# Altium schematic symbol library jlcpcb_2025_04_capacitors_extended_1206.schlib: 2503 symbols (part 12 of 14)
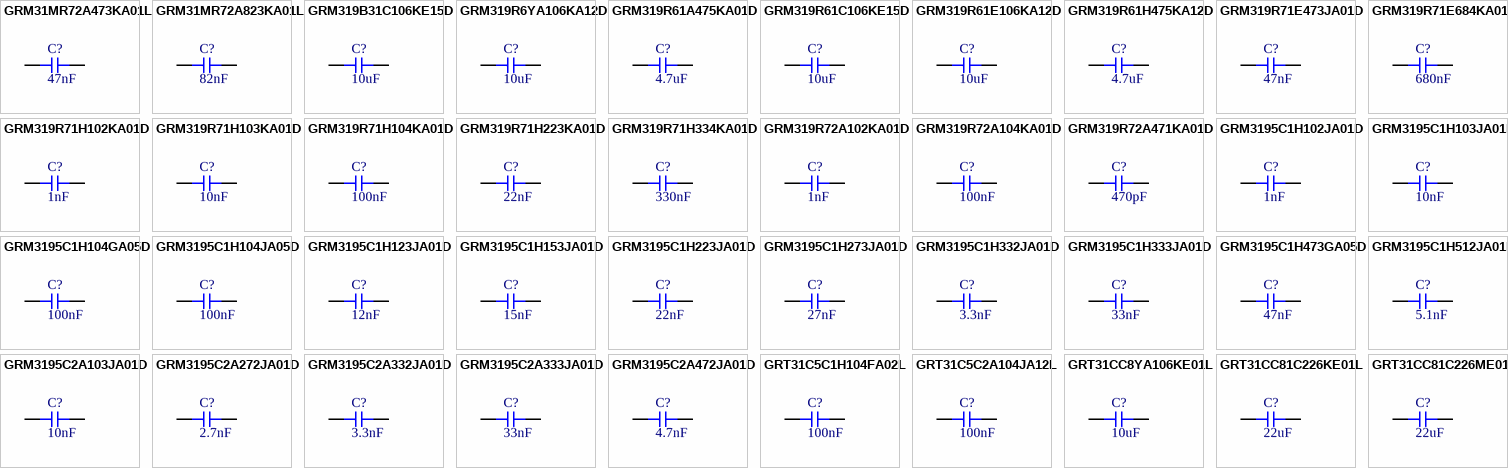
[diagram p73: symbols GRM31MR72A473KA01L to GRT31CC81C226ME01L]

## GRM319R71E684KA01D
designator C?  Capacitance: 680nF  (hidden comment: *)
Capacitor, Ceramic (MLCC), 680nF, ±10%, 25V, X7R, ±10%, SMD 1206; Manufacturer: Murata Electronics; Manufacturer Part Number: GRM319R71E684KA01D; Package Size: 1206; JLCPCB Basic Part: No; JLCPCB Part Number: C913695; Supplier 1: LCSC; Category: Capacitors - MLCC; Supplier Part Number 1: C913695; Tolerance: ±10%; Voltage Rating: 25V; Temperature Coefficient: X7R; RoHS: Yes; ComponentLink1Description: Datasheet; ComponentLink1URL: https://wmsc.lcsc.com/wmsc/upload/file/pdf/v2/lcsc/2304140030_Murata-Electronics-GRM319R71E684KA01D_C913695.pdf; ComponentLink2Description: JLCPCB Part URL; ComponentLink2URL: https://jlcpcb.com/partdetail/C913695; ComponentLink3Description: LCSC Part URL; ComponentLink3URL: https://lcsc.com/product-detail/Multilayer-Ceramic-Capacitors-MLCC---SMD-SMT_Murata-Electronics-Murata-Electronics-GRM319R71E684KA01D_C913695.html
footprint CAP-1206 (1206 (3216M) Capacitor)
pins: 1, 2

## GRM319R71H102KA01D
designator C?  Capacitance: 1nF  (hidden comment: *)
Capacitor, Ceramic (MLCC), 1nF, ±10%, 50V, X7R, ±10%, SMD 1206; Manufacturer: Murata Electronics; Manufacturer Part Number: GRM319R71H102KA01D; Package Size: 1206; JLCPCB Basic Part: No; JLCPCB Part Number: C440200; Supplier 1: LCSC; Category: Capacitors - MLCC; Supplier Part Number 1: C440200; Tolerance: ±10%; Voltage Rating: 50V; Temperature Coefficient: X7R; RoHS: Yes; ComponentLink1Description: Datasheet; ComponentLink1URL: https://wmsc.lcsc.com/wmsc/upload/file/pdf/v2/lcsc/2304140030_Murata-Electronics-GRM319R71H102KA01D_C440200.pdf; ComponentLink2Description: JLCPCB Part URL; ComponentLink2URL: https://jlcpcb.com/partdetail/C440200; ComponentLink3Description: LCSC Part URL; ComponentLink3URL: https://lcsc.com/product-detail/Multilayer-Ceramic-Capacitors-MLCC---SMD-SMT_Murata-Electronics-Murata-Electronics-GRM319R71H102KA01D_C440200.html
footprint CAP-1206 (1206 (3216M) Capacitor)
pins: 1, 2

## GRM319R71H103KA01D
designator C?  Capacitance: 10nF  (hidden comment: *)
Capacitor, Ceramic (MLCC), 10nF, ±10%, 50V, X7R, ±10%, SMD 1206; Manufacturer: Murata Electronics; Manufacturer Part Number: GRM319R71H103KA01D; Package Size: 1206; JLCPCB Basic Part: No; JLCPCB Part Number: C521245; Supplier 1: LCSC; Category: Capacitors - MLCC; Supplier Part Number 1: C521245; Tolerance: ±10%; Voltage Rating: 50V; Temperature Coefficient: X7R; RoHS: Yes; ComponentLink1Description: Datasheet; ComponentLink1URL: https://wmsc.lcsc.com/wmsc/upload/file/pdf/v2/lcsc/2304140030_Murata-Electronics-GRM319R71H103KA01D_C521245.pdf; ComponentLink2Description: JLCPCB Part URL; ComponentLink2URL: https://jlcpcb.com/partdetail/C521245; ComponentLink3Description: LCSC Part URL; ComponentLink3URL: https://lcsc.com/product-detail/Multilayer-Ceramic-Capacitors-MLCC---SMD-SMT_Murata-Electronics-Murata-Electronics-GRM319R71H103KA01D_C521245.html
footprint CAP-1206 (1206 (3216M) Capacitor)
pins: 1, 2

## GRM319R71H104KA01D
designator C?  Capacitance: 100nF  (hidden comment: *)
Capacitor, Ceramic (MLCC), 100nF, ±10%, 50V, X7R, ±10%, SMD 1206; Manufacturer: Murata Electronics; Manufacturer Part Number: GRM319R71H104KA01D; Package Size: 1206; JLCPCB Basic Part: No; JLCPCB Part Number: C86047; Supplier 1: LCSC; Category: Capacitors - MLCC; Supplier Part Number 1: C86047; Tolerance: ±10%; Voltage Rating: 50V; Temperature Coefficient: X7R; RoHS: Yes; ComponentLink1Description: Datasheet; ComponentLink1URL: https://wmsc.lcsc.com/wmsc/upload/file/pdf/v2/lcsc/2304140030_Murata-Electronics-GRM319R71H104KA01D_C86047.pdf; ComponentLink2Description: JLCPCB Part URL; ComponentLink2URL: https://jlcpcb.com/partdetail/C86047; ComponentLink3Description: LCSC Part URL; ComponentLink3URL: https://lcsc.com/product-detail/Multilayer-Ceramic-Capacitors-MLCC---SMD-SMT_Murata-Electronics-Murata-Electronics-GRM319R71H104KA01D_C86047.html
footprint CAP-1206 (1206 (3216M) Capacitor)
pins: 1, 2

## GRM319R71H223KA01D
designator C?  Capacitance: 22nF  (hidden comment: *)
Capacitor, Ceramic (MLCC), 22nF, ±10%, 50V, X7R, ±10%, SMD 1206; Manufacturer: Murata Electronics; Manufacturer Part Number: GRM319R71H223KA01D; Package Size: 1206; JLCPCB Basic Part: No; JLCPCB Part Number: C124126; Supplier 1: LCSC; Category: Capacitors - MLCC; Supplier Part Number 1: C124126; Tolerance: ±10%; Voltage Rating: 50V; Temperature Coefficient: X7R; RoHS: Yes; ComponentLink1Description: Datasheet; ComponentLink1URL: https://wmsc.lcsc.com/wmsc/upload/file/pdf/v2/lcsc/1810201307_Murata-Electronics-GRM319R71H223KA01D_C124126.pdf; ComponentLink2Description: JLCPCB Part URL; ComponentLink2URL: https://jlcpcb.com/partdetail/C124126; ComponentLink3Description: LCSC Part URL; ComponentLink3URL: https://lcsc.com/product-detail/Multilayer-Ceramic-Capacitors-MLCC---SMD-SMT_Murata-Electronics-Murata-Electronics-GRM319R71H223KA01D_C124126.html
footprint CAP-1206 (1206 (3216M) Capacitor)
pins: 1, 2

## GRM319R71H334KA01D
designator C?  Capacitance: 330nF  (hidden comment: *)
Capacitor, Ceramic (MLCC), 330nF, ±10%, null, X7R, ±10%, SMD 1206; Manufacturer: Murata Electronics; Manufacturer Part Number: GRM319R71H334KA01D; Package Size: 1206; JLCPCB Basic Part: No; JLCPCB Part Number: C913734; Supplier 1: LCSC; Category: Capacitors - MLCC; Supplier Part Number 1: C913734; Tolerance: ±10%; Voltage Rating: null; Temperature Coefficient: X7R; RoHS: Yes; ComponentLink1Description: Datasheet; ComponentLink1URL: https://wmsc.lcsc.com/wmsc/upload/file/pdf/v2/lcsc/2201131300_Murata-Electronics-GRM319R71H334KA01D_C913734.pdf; ComponentLink2Description: JLCPCB Part URL; ComponentLink2URL: https://jlcpcb.com/partdetail/C913734; ComponentLink3Description: LCSC Part URL; ComponentLink3URL: https://lcsc.com/product-detail/Multilayer-Ceramic-Capacitors-MLCC---SMD-SMT_Murata-Electronics-Murata-Electronics-GRM319R71H334KA01D_C913734.html
footprint CAP-1206 (1206 (3216M) Capacitor)
pins: 1, 2

## GRM319R72A102KA01D
designator C?  Capacitance: 1nF  (hidden comment: *)
Capacitor, Ceramic (MLCC), 1nF, ±10%, 100V, X7R, ±10%, SMD 1206; Manufacturer: Murata Electronics; Manufacturer Part Number: GRM319R72A102KA01D; Package Size: 1206; JLCPCB Basic Part: No; JLCPCB Part Number: C162438; Supplier 1: LCSC; Category: Capacitors - MLCC; Supplier Part Number 1: C162438; Tolerance: ±10%; Voltage Rating: 100V; Temperature Coefficient: X7R; RoHS: Yes; ComponentLink1Description: Datasheet; ComponentLink1URL: https://wmsc.lcsc.com/wmsc/upload/file/pdf/v2/lcsc/2308111642_Murata-Electronics-GRM319R72A102KA01D_C162438.pdf; ComponentLink2Description: JLCPCB Part URL; ComponentLink2URL: https://jlcpcb.com/partdetail/C162438; ComponentLink3Description: LCSC Part URL; ComponentLink3URL: https://lcsc.com/product-detail/Multilayer-Ceramic-Capacitors-MLCC---SMD-SMT_Murata-Electronics-Murata-Electronics-GRM319R72A102KA01D_C162438.html
footprint CAP-1206 (1206 (3216M) Capacitor)
pins: 1, 2

## GRM319R72A104KA01D
designator C?  Capacitance: 100nF  (hidden comment: *)
Capacitor, Ceramic (MLCC), 100nF, ±10%, 100V, X7R, ±10%, SMD 1206; Manufacturer: Murata Electronics; Manufacturer Part Number: GRM319R72A104KA01D; Package Size: 1206; JLCPCB Basic Part: No; JLCPCB Part Number: C97932; Supplier 1: LCSC; Category: Capacitors - MLCC; Supplier Part Number 1: C97932; Tolerance: ±10%; Voltage Rating: 100V; Temperature Coefficient: X7R; RoHS: Yes; ComponentLink1Description: Datasheet; ComponentLink1URL: https://wmsc.lcsc.com/wmsc/upload/file/pdf/v2/lcsc/1810201314_Murata-Electronics-GRM319R72A104KA01D_C97932.pdf; ComponentLink2Description: JLCPCB Part URL; ComponentLink2URL: https://jlcpcb.com/partdetail/C97932; ComponentLink3Description: LCSC Part URL; ComponentLink3URL: https://lcsc.com/product-detail/Multilayer-Ceramic-Capacitors-MLCC---SMD-SMT_Murata-Electronics-Murata-Electronics-GRM319R72A104KA01D_C97932.html
footprint CAP-1206 (1206 (3216M) Capacitor)
pins: 1, 2

## GRM319R72A471KA01D
designator C?  Capacitance: 470pF  (hidden comment: *)
Capacitor, Ceramic (MLCC), 470pF, ±10%, ±10%, SMD 1206; Manufacturer: Murata Electronics; Manufacturer Part Number: GRM319R72A471KA01D; Package Size: 1206; JLCPCB Basic Part: No; JLCPCB Part Number: C913733; Supplier 1: LCSC; Category: Capacitors - MLCC; Supplier Part Number 1: C913733; Tolerance: ±10%; RoHS: Yes; ComponentLink1Description: Datasheet; ComponentLink1URL: https://wmsc.lcsc.com/wmsc/upload/file/pdf/v2/lcsc/2304140030_Murata-Electronics-GRM319R72A471KA01D_C913733.pdf; ComponentLink2Description: JLCPCB Part URL; ComponentLink2URL: https://jlcpcb.com/partdetail/C913733; ComponentLink3Description: LCSC Part URL; ComponentLink3URL: https://lcsc.com/product-detail/Multilayer-Ceramic-Capacitors-MLCC---SMD-SMT_Murata-Electronics-Murata-Electronics-GRM319R72A471KA01D_C913733.html
footprint CAP-1206 (1206 (3216M) Capacitor)
pins: 1, 2

## GRM3195C1H102JA01D
designator C?  Capacitance: 1nF  (hidden comment: *)
Capacitor, Ceramic (MLCC), 1nF, ±5%, 50V, C0G, ±5%, SMD 1206; Manufacturer: Murata Electronics; Manufacturer Part Number: GRM3195C1H102JA01D; Package Size: 1206; JLCPCB Basic Part: No; JLCPCB Part Number: C162431; Supplier 1: LCSC; Category: Capacitors - MLCC; Supplier Part Number 1: C162431; Tolerance: ±5%; Voltage Rating: 50V; Temperature Coefficient: C0G; RoHS: Yes; ComponentLink1Description: Datasheet; ComponentLink1URL: https://wmsc.lcsc.com/wmsc/upload/file/pdf/v2/lcsc/1810201331_Murata-Electronics-GRM3195C1H102JA01D_C162431.pdf; ComponentLink2Description: JLCPCB Part URL; ComponentLink2URL: https://jlcpcb.com/partdetail/C162431; ComponentLink3Description: LCSC Part URL; ComponentLink3URL: https://lcsc.com/product-detail/Multilayer-Ceramic-Capacitors-MLCC---SMD-SMT_Murata-Electronics-Murata-Electronics-GRM3195C1H102JA01D_C162431.html
footprint CAP-1206 (1206 (3216M) Capacitor)
pins: 1, 2

## GRM3195C1H103JA01D
designator C?  Capacitance: 10nF  (hidden comment: *)
Capacitor, Ceramic (MLCC), 10nF, ±5%, 50V, C0G, ±5%, SMD 1206; Manufacturer: Murata Electronics; Manufacturer Part Number: GRM3195C1H103JA01D; Package Size: 1206; JLCPCB Basic Part: No; JLCPCB Part Number: C97928; Supplier 1: LCSC; Category: Capacitors - MLCC; Supplier Part Number 1: C97928; Tolerance: ±5%; Voltage Rating: 50V; Temperature Coefficient: C0G; RoHS: Yes; ComponentLink1Description: Datasheet; ComponentLink1URL: https://wmsc.lcsc.com/wmsc/upload/file/pdf/v2/lcsc/1810201314_Murata-Electronics-GRM3195C1H103JA01D_C97928.pdf; ComponentLink2Description: JLCPCB Part URL; ComponentLink2URL: https://jlcpcb.com/partdetail/C97928; ComponentLink3Description: LCSC Part URL; ComponentLink3URL: https://lcsc.com/product-detail/Multilayer-Ceramic-Capacitors-MLCC---SMD-SMT_Murata-Electronics-Murata-Electronics-GRM3195C1H103JA01D_C97928.html
footprint CAP-1206 (1206 (3216M) Capacitor)
pins: 1, 2

## GRM3195C1H104GA05D
designator C?  Capacitance: 100nF  (hidden comment: *)
Capacitor, Ceramic (MLCC), 100nF, ±2%, null, null, ±2%, SMD 1206; Manufacturer: Murata Electronics; Manufacturer Part Number: GRM3195C1H104GA05D; Package Size: 1206; JLCPCB Basic Part: No; JLCPCB Part Number: C907944; Supplier 1: LCSC; Category: Capacitors - MLCC; Supplier Part Number 1: C907944; Tolerance: ±2%; Voltage Rating: null; Temperature Coefficient: null; RoHS: Yes; ComponentLink1Description: Datasheet; ComponentLink1URL: https://wmsc.lcsc.com/wmsc/upload/file/pdf/v2/lcsc/2201242100_Murata-Electronics-GRM3195C1H104GA05D_C907944.pdf; ComponentLink2Description: JLCPCB Part URL; ComponentLink2URL: https://jlcpcb.com/partdetail/C907944; ComponentLink3Description: LCSC Part URL; ComponentLink3URL: https://lcsc.com/product-detail/Multilayer-Ceramic-Capacitors-MLCC---SMD-SMT_Murata-Electronics-Murata-Electronics-GRM3195C1H104GA05D_C907944.html
footprint CAP-1206 (1206 (3216M) Capacitor)
pins: 1, 2

## GRM3195C1H104JA05D
designator C?  Capacitance: 100nF  (hidden comment: *)
Capacitor, Ceramic (MLCC), 100nF, ±5%, 50V, C0G, ±5%, SMD 1206; Manufacturer: Murata Electronics; Manufacturer Part Number: GRM3195C1H104JA05D; Package Size: 1206; JLCPCB Basic Part: No; JLCPCB Part Number: C363929; Supplier 1: LCSC; Category: Capacitors - MLCC; Supplier Part Number 1: C363929; Tolerance: ±5%; Voltage Rating: 50V; Temperature Coefficient: C0G; RoHS: Yes; ComponentLink1Description: Datasheet; ComponentLink1URL: https://wmsc.lcsc.com/wmsc/upload/file/pdf/v2/lcsc/2304140030_Murata-Electronics-GRM3195C1H104JA05D_C363929.pdf; ComponentLink2Description: JLCPCB Part URL; ComponentLink2URL: https://jlcpcb.com/partdetail/C363929; ComponentLink3Description: LCSC Part URL; ComponentLink3URL: https://lcsc.com/product-detail/Multilayer-Ceramic-Capacitors-MLCC---SMD-SMT_Murata-Electronics-Murata-Electronics-GRM3195C1H104JA05D_C363929.html
footprint CAP-1206 (1206 (3216M) Capacitor)
pins: 1, 2

## GRM3195C1H123JA01D
designator C?  Capacitance: 12nF  (hidden comment: *)
Capacitor, Ceramic (MLCC), 12nF, ±5%, null, null, ±5%, SMD 1206; Manufacturer: Murata Electronics; Manufacturer Part Number: GRM3195C1H123JA01D; Package Size: 1206; JLCPCB Basic Part: No; JLCPCB Part Number: C710999; Supplier 1: LCSC; Category: Capacitors - MLCC; Supplier Part Number 1: C710999; Tolerance: ±5%; Voltage Rating: null; Temperature Coefficient: null; RoHS: Yes; ComponentLink1Description: Datasheet; ComponentLink1URL: https://wmsc.lcsc.com/wmsc/upload/file/pdf/v2/lcsc/2009141235_Murata-Electronics-GRM3195C1H123JA01D_C710999.pdf; ComponentLink2Description: JLCPCB Part URL; ComponentLink2URL: https://jlcpcb.com/partdetail/C710999; ComponentLink3Description: LCSC Part URL; ComponentLink3URL: https://lcsc.com/product-detail/Multilayer-Ceramic-Capacitors-MLCC---SMD-SMT_Murata-Electronics-Murata-Electronics-GRM3195C1H123JA01D_C710999.html
footprint CAP-1206 (1206 (3216M) Capacitor)
pins: 1, 2

## GRM3195C1H153JA01D
designator C?  Capacitance: 15nF  (hidden comment: *)
Capacitor, Ceramic (MLCC), 15nF, ±5%, 50V, C0G, ±5%, SMD 1206; Manufacturer: Murata Electronics; Manufacturer Part Number: GRM3195C1H153JA01D; Package Size: 1206; JLCPCB Basic Part: No; JLCPCB Part Number: C440199; Supplier 1: LCSC; Category: Capacitors - MLCC; Supplier Part Number 1: C440199; Tolerance: ±5%; Voltage Rating: 50V; Temperature Coefficient: C0G; RoHS: Yes; ComponentLink1Description: Datasheet; ComponentLink1URL: https://wmsc.lcsc.com/wmsc/upload/file/pdf/v2/lcsc/2304140030_Murata-Electronics-GRM3195C1H153JA01D_C440199.pdf; ComponentLink2Description: JLCPCB Part URL; ComponentLink2URL: https://jlcpcb.com/partdetail/C440199; ComponentLink3Description: LCSC Part URL; ComponentLink3URL: https://lcsc.com/product-detail/Multilayer-Ceramic-Capacitors-MLCC---SMD-SMT_Murata-Electronics-Murata-Electronics-GRM3195C1H153JA01D_C440199.html
footprint CAP-1206 (1206 (3216M) Capacitor)
pins: 1, 2

## GRM3195C1H223JA01D
designator C?  Capacitance: 22nF  (hidden comment: *)
Capacitor, Ceramic (MLCC), 22nF, ±5%, 50V, C0G, ±5%, SMD 1206; Manufacturer: Murata Electronics; Manufacturer Part Number: GRM3195C1H223JA01D; Package Size: 1206; JLCPCB Basic Part: No; JLCPCB Part Number: C97929; Supplier 1: LCSC; Category: Capacitors - MLCC; Supplier Part Number 1: C97929; Tolerance: ±5%; Voltage Rating: 50V; Temperature Coefficient: C0G; RoHS: Yes; ComponentLink1Description: Datasheet; ComponentLink1URL: https://wmsc.lcsc.com/wmsc/upload/file/pdf/v2/lcsc/1810201308_Murata-Electronics-GRM3195C1H223JA01D_C97929.pdf; ComponentLink2Description: JLCPCB Part URL; ComponentLink2URL: https://jlcpcb.com/partdetail/C97929; ComponentLink3Description: LCSC Part URL; ComponentLink3URL: https://lcsc.com/product-detail/Multilayer-Ceramic-Capacitors-MLCC---SMD-SMT_Murata-Electronics-Murata-Electronics-GRM3195C1H223JA01D_C97929.html
footprint CAP-1206 (1206 (3216M) Capacitor)
pins: 1, 2

## GRM3195C1H273JA01D
designator C?  Capacitance: 27nF  (hidden comment: *)
Capacitor, Ceramic (MLCC), 27nF, ±5%, 50V, C0G, ±5%, SMD 1206; Manufacturer: Murata Electronics; Manufacturer Part Number: GRM3195C1H273JA01D; Package Size: 1206; JLCPCB Basic Part: No; JLCPCB Part Number: C162433; Supplier 1: LCSC; Category: Capacitors - MLCC; Supplier Part Number 1: C162433; Tolerance: ±5%; Voltage Rating: 50V; Temperature Coefficient: C0G; RoHS: Yes; ComponentLink1Description: Datasheet; ComponentLink1URL: https://wmsc.lcsc.com/wmsc/upload/file/pdf/v2/lcsc/2308111642_Murata-Electronics-GRM3195C1H273JA01D_C162433.pdf; ComponentLink2Description: JLCPCB Part URL; ComponentLink2URL: https://jlcpcb.com/partdetail/C162433; ComponentLink3Description: LCSC Part URL; ComponentLink3URL: https://lcsc.com/product-detail/Multilayer-Ceramic-Capacitors-MLCC---SMD-SMT_Murata-Electronics-Murata-Electronics-GRM3195C1H273JA01D_C162433.html
footprint CAP-1206 (1206 (3216M) Capacitor)
pins: 1, 2

## GRM3195C1H332JA01D
designator C?  Capacitance: 3.3nF  (hidden comment: *)
Capacitor, Ceramic (MLCC), 3.3nF, ±5%, 50V, C0G, ±5%, SMD 1206; Manufacturer: Murata Electronics; Manufacturer Part Number: GRM3195C1H332JA01D; Package Size: 1206; JLCPCB Basic Part: No; JLCPCB Part Number: C464447; Supplier 1: LCSC; Category: Capacitors - MLCC; Supplier Part Number 1: C464447; Tolerance: ±5%; Voltage Rating: 50V; Temperature Coefficient: C0G; RoHS: Yes; ComponentLink1Description: Datasheet; ComponentLink1URL: https://wmsc.lcsc.com/wmsc/upload/file/pdf/v2/lcsc/2304140030_Murata-Electronics-GRM3195C1H332JA01D_C464447.pdf; ComponentLink2Description: JLCPCB Part URL; ComponentLink2URL: https://jlcpcb.com/partdetail/C464447; ComponentLink3Description: LCSC Part URL; ComponentLink3URL: https://lcsc.com/product-detail/Multilayer-Ceramic-Capacitors-MLCC---SMD-SMT_Murata-Electronics-Murata-Electronics-GRM3195C1H332JA01D_C464447.html
footprint CAP-1206 (1206 (3216M) Capacitor)
pins: 1, 2

## GRM3195C1H333JA01D
designator C?  Capacitance: 33nF  (hidden comment: *)
Capacitor, Ceramic (MLCC), 33nF, ±5%, 50V, C0G, ±5%, SMD 1206; Manufacturer: Murata Electronics; Manufacturer Part Number: GRM3195C1H333JA01D; Package Size: 1206; JLCPCB Basic Part: No; JLCPCB Part Number: C97930; Supplier 1: LCSC; Category: Capacitors - MLCC; Supplier Part Number 1: C97930; Tolerance: ±5%; Voltage Rating: 50V; Temperature Coefficient: C0G; RoHS: Yes; ComponentLink1Description: Datasheet; ComponentLink1URL: https://wmsc.lcsc.com/wmsc/upload/file/pdf/v2/lcsc/1810201314_Murata-Electronics-GRM3195C1H333JA01D_C97930.pdf; ComponentLink2Description: JLCPCB Part URL; ComponentLink2URL: https://jlcpcb.com/partdetail/C97930; ComponentLink3Description: LCSC Part URL; ComponentLink3URL: https://lcsc.com/product-detail/Multilayer-Ceramic-Capacitors-MLCC---SMD-SMT_Murata-Electronics-Murata-Electronics-GRM3195C1H333JA01D_C97930.html
footprint CAP-1206 (1206 (3216M) Capacitor)
pins: 1, 2

## GRM3195C1H473GA05D
designator C?  Capacitance: 47nF  (hidden comment: *)
Capacitor, Ceramic (MLCC), 47nF, ±2%, ±2%, SMD 1206; Manufacturer: Murata Electronics; Manufacturer Part Number: GRM3195C1H473GA05D; Package Size: 1206; JLCPCB Basic Part: No; JLCPCB Part Number: C5274021; Supplier 1: LCSC; Category: Capacitors - MLCC; Supplier Part Number 1: C5274021; Tolerance: ±2%; RoHS: Yes; ComponentLink1Description: Datasheet; ComponentLink1URL: https://wmsc.lcsc.com/wmsc/upload/file/pdf/v2/lcsc/2211171800_Murata-Electronics-GRM3195C1H473GA05D_C5274021.pdf; ComponentLink2Description: JLCPCB Part URL; ComponentLink2URL: https://jlcpcb.com/partdetail/C5274021; ComponentLink3Description: LCSC Part URL; ComponentLink3URL: https://lcsc.com/product-detail/Multilayer-Ceramic-Capacitors-MLCC---SMD-SMT_Murata-Electronics-Murata-Electronics-GRM3195C1H473GA05D_C5274021.html
footprint CAP-1206 (1206 (3216M) Capacitor)
pins: 1, 2

## GRM3195C1H512JA01D
designator C?  Capacitance: 5.1nF  (hidden comment: *)
Capacitor, Ceramic (MLCC), 5.1nF, ±5%, 50V, C0G, ±5%, SMD 1206; Manufacturer: Murata Electronics; Manufacturer Part Number: GRM3195C1H512JA01D; Package Size: 1206; JLCPCB Basic Part: No; JLCPCB Part Number: C162434; Supplier 1: LCSC; Category: Capacitors - MLCC; Supplier Part Number 1: C162434; Tolerance: ±5%; Voltage Rating: 50V; Temperature Coefficient: C0G; RoHS: Yes; ComponentLink1Description: Datasheet; ComponentLink1URL: https://wmsc.lcsc.com/wmsc/upload/file/pdf/v2/lcsc/2308111712_Murata-Electronics-GRM3195C1H512JA01D_C162434.pdf; ComponentLink2Description: JLCPCB Part URL; ComponentLink2URL: https://jlcpcb.com/partdetail/C162434; ComponentLink3Description: LCSC Part URL; ComponentLink3URL: https://lcsc.com/product-detail/Multilayer-Ceramic-Capacitors-MLCC---SMD-SMT_Murata-Electronics-Murata-Electronics-GRM3195C1H512JA01D_C162434.html
footprint CAP-1206 (1206 (3216M) Capacitor)
pins: 1, 2

## GRM3195C2A103JA01D
designator C?  Capacitance: 10nF  (hidden comment: *)
Capacitor, Ceramic (MLCC), 10nF, ±5%, 100V, null, ±5%, SMD 1206; Manufacturer: Murata Electronics; Manufacturer Part Number: GRM3195C2A103JA01D; Package Size: 1206; JLCPCB Basic Part: No; JLCPCB Part Number: C703076; Supplier 1: LCSC; Category: Capacitors - MLCC; Supplier Part Number 1: C703076; Tolerance: ±5%; Voltage Rating: 100V; Temperature Coefficient: null; RoHS: Yes; ComponentLink1Description: Datasheet; ComponentLink1URL: https://wmsc.lcsc.com/wmsc/upload/file/pdf/v2/lcsc/2304140030_Murata-Electronics-GRM3195C2A103JA01D_C703076.pdf; ComponentLink2Description: JLCPCB Part URL; ComponentLink2URL: https://jlcpcb.com/partdetail/C703076; ComponentLink3Description: LCSC Part URL; ComponentLink3URL: https://lcsc.com/product-detail/Multilayer-Ceramic-Capacitors-MLCC---SMD-SMT_Murata-Electronics-Murata-Electronics-GRM3195C2A103JA01D_C703076.html
footprint CAP-1206 (1206 (3216M) Capacitor)
pins: 1, 2

## GRM3195C2A272JA01D
designator C?  Capacitance: 2.7nF  (hidden comment: *)
Capacitor, Ceramic (MLCC), 2.7nF, ±5%, 100V, null, ±5%, SMD 1206; Manufacturer: Murata Electronics; Manufacturer Part Number: GRM3195C2A272JA01D; Package Size: 1206; JLCPCB Basic Part: No; JLCPCB Part Number: C913581; Supplier 1: LCSC; Category: Capacitors - MLCC; Supplier Part Number 1: C913581; Tolerance: ±5%; Voltage Rating: 100V; Temperature Coefficient: null; RoHS: Yes; ComponentLink1Description: Datasheet; ComponentLink1URL: https://wmsc.lcsc.com/wmsc/upload/file/pdf/v2/lcsc/2011151633_Murata-Electronics-GRM3195C2A272JA01D_C913581.pdf; ComponentLink2Description: JLCPCB Part URL; ComponentLink2URL: https://jlcpcb.com/partdetail/C913581; ComponentLink3Description: LCSC Part URL; ComponentLink3URL: https://lcsc.com/product-detail/Multilayer-Ceramic-Capacitors-MLCC---SMD-SMT_Murata-Electronics-Murata-Electronics-GRM3195C2A272JA01D_C913581.html
footprint CAP-1206 (1206 (3216M) Capacitor)
pins: 1, 2

## GRM3195C2A332JA01D
designator C?  Capacitance: 3.3nF  (hidden comment: *)
Capacitor, Ceramic (MLCC), 3.3nF, ±5%, 100V, null, ±5%, SMD 1206; Manufacturer: Murata Electronics; Manufacturer Part Number: GRM3195C2A332JA01D; Package Size: 1206; JLCPCB Basic Part: No; JLCPCB Part Number: C426079; Supplier 1: LCSC; Category: Capacitors - MLCC; Supplier Part Number 1: C426079; Tolerance: ±5%; Voltage Rating: 100V; Temperature Coefficient: null; RoHS: Yes; ComponentLink1Description: Datasheet; ComponentLink1URL: https://wmsc.lcsc.com/wmsc/upload/file/pdf/v2/lcsc/2304140030_Murata-Electronics-GRM3195C2A332JA01D_C426079.pdf; ComponentLink2Description: JLCPCB Part URL; ComponentLink2URL: https://jlcpcb.com/partdetail/C426079; ComponentLink3Description: LCSC Part URL; ComponentLink3URL: https://lcsc.com/product-detail/Multilayer-Ceramic-Capacitors-MLCC---SMD-SMT_Murata-Electronics-Murata-Electronics-GRM3195C2A332JA01D_C426079.html
footprint CAP-1206 (1206 (3216M) Capacitor)
pins: 1, 2

## GRM3195C2A333JA01D
designator C?  Capacitance: 33nF  (hidden comment: *)
Capacitor, Ceramic (MLCC), 33nF, ±5%, 100V, null, ±5%, SMD 1206; Manufacturer: Murata Electronics; Manufacturer Part Number: GRM3195C2A333JA01D; Package Size: 1206; JLCPCB Basic Part: No; JLCPCB Part Number: C5200606; Supplier 1: LCSC; Category: Capacitors - MLCC; Supplier Part Number 1: C5200606; Tolerance: ±5%; Voltage Rating: 100V; Temperature Coefficient: null; RoHS: Yes; ComponentLink1Description: Datasheet; ComponentLink1URL: https://wmsc.lcsc.com/wmsc/upload/file/pdf/v2/lcsc/2210251800_Murata-Electronics-GRM3195C2A333JA01D_C5200606.pdf; ComponentLink2Description: JLCPCB Part URL; ComponentLink2URL: https://jlcpcb.com/partdetail/C5200606; ComponentLink3Description: LCSC Part URL; ComponentLink3URL: https://lcsc.com/product-detail/Multilayer-Ceramic-Capacitors-MLCC---SMD-SMT_Murata-Electronics-Murata-Electronics-GRM3195C2A333JA01D_C5200606.html
footprint CAP-1206 (1206 (3216M) Capacitor)
pins: 1, 2

## GRM3195C2A472JA01D
designator C?  Capacitance: 4.7nF  (hidden comment: *)
Capacitor, Ceramic (MLCC), 4.7nF, ±5%, 100V, C0G, ±5%, SMD 1206; Manufacturer: Murata Electronics; Manufacturer Part Number: GRM3195C2A472JA01D; Package Size: 1206; JLCPCB Basic Part: No; JLCPCB Part Number: C393168; Supplier 1: LCSC; Category: Capacitors - MLCC; Supplier Part Number 1: C393168; Tolerance: ±5%; Voltage Rating: 100V; Temperature Coefficient: C0G; RoHS: Yes; ComponentLink1Description: Datasheet; ComponentLink1URL: https://wmsc.lcsc.com/wmsc/upload/file/pdf/v2/lcsc/2304140030_Murata-Electronics-GRM3195C2A472JA01D_C393168.pdf; ComponentLink2Description: JLCPCB Part URL; ComponentLink2URL: https://jlcpcb.com/partdetail/C393168; ComponentLink3Description: LCSC Part URL; ComponentLink3URL: https://lcsc.com/product-detail/Multilayer-Ceramic-Capacitors-MLCC---SMD-SMT_Murata-Electronics-Murata-Electronics-GRM3195C2A472JA01D_C393168.html
footprint CAP-1206 (1206 (3216M) Capacitor)
pins: 1, 2

## GRT31C5C1H104FA02L
designator C?  Capacitance: 100nF  (hidden comment: *)
Capacitor, Ceramic (MLCC), 100nF, ±1%, 50V, C0G, ±1%, SMD 1206; Manufacturer: Murata Electronics; Manufacturer Part Number: GRT31C5C1H104FA02L; Package Size: 1206; JLCPCB Basic Part: No; JLCPCB Part Number: C3839854; Supplier 1: LCSC; Category: Capacitors - MLCC; Supplier Part Number 1: C3839854; Tolerance: ±1%; Voltage Rating: 50V; Temperature Coefficient: C0G; RoHS: Yes; ComponentLink1Description: Datasheet; ComponentLink1URL: https://wmsc.lcsc.com/wmsc/upload/file/pdf/v2/lcsc/2308111526_Murata-Electronics-GRT31C5C1H104FA02L_C3839854.pdf; ComponentLink2Description: JLCPCB Part URL; ComponentLink2URL: https://jlcpcb.com/partdetail/C3839854; ComponentLink3Description: LCSC Part URL; ComponentLink3URL: https://lcsc.com/product-detail/Multilayer-Ceramic-Capacitors-MLCC---SMD-SMT_Murata-Electronics-Murata-Electronics-GRT31C5C1H104FA02L_C3839854.html
footprint CAP-1206 (1206 (3216M) Capacitor)
pins: 1, 2

## GRT31C5C2A104JA12L
designator C?  Capacitance: 100nF  (hidden comment: *)
Capacitor, Ceramic (MLCC), 100nF, ±5%, 100V, C0G, ±5%, SMD 1206; Manufacturer: Murata Electronics; Manufacturer Part Number: GRT31C5C2A104JA12L; Package Size: 1206; JLCPCB Basic Part: No; JLCPCB Part Number: C3860528; Supplier 1: LCSC; Category: Capacitors - MLCC; Supplier Part Number 1: C3860528; Tolerance: ±5%; Voltage Rating: 100V; Temperature Coefficient: C0G; RoHS: Yes; ComponentLink1Description: Datasheet; ComponentLink1URL: https://wmsc.lcsc.com/wmsc/upload/file/pdf/v2/lcsc/2308111526_Murata-Electronics-GRT31C5C2A104JA12L_C3860528.pdf; ComponentLink2Description: JLCPCB Part URL; ComponentLink2URL: https://jlcpcb.com/partdetail/C3860528; ComponentLink3Description: LCSC Part URL; ComponentLink3URL: https://lcsc.com/product-detail/Multilayer-Ceramic-Capacitors-MLCC---SMD-SMT_Murata-Electronics-Murata-Electronics-GRT31C5C2A104JA12L_C3860528.html
footprint CAP-1206 (1206 (3216M) Capacitor)
pins: 1, 2

## GRT31CC8YA106KE01L
designator C?  Capacitance: 10uF  (hidden comment: *)
Capacitor, Ceramic (MLCC), 10uF, ±10%, 35V, ±10%, SMD 1206; Manufacturer: Murata Electronics; Manufacturer Part Number: GRT31CC8YA106KE01L; Package Size: 1206; JLCPCB Basic Part: No; JLCPCB Part Number: C711107; Supplier 1: LCSC; Category: Capacitors - MLCC; Supplier Part Number 1: C711107; Tolerance: ±10%; Voltage Rating: 35V; RoHS: Yes; ComponentLink1Description: Datasheet; ComponentLink1URL: https://wmsc.lcsc.com/wmsc/upload/file/pdf/v2/lcsc/2104061735_Murata-Electronics-GRT31CC8YA106KE01L_C711107.pdf; ComponentLink2Description: JLCPCB Part URL; ComponentLink2URL: https://jlcpcb.com/partdetail/C711107; ComponentLink3Description: LCSC Part URL; ComponentLink3URL: https://lcsc.com/product-detail/Multilayer-Ceramic-Capacitors-MLCC---SMD-SMT_Murata-Electronics-Murata-Electronics-GRT31CC8YA106KE01L_C711107.html
footprint CAP-1206 (1206 (3216M) Capacitor)
pins: 1, 2

## GRT31CC81C226KE01L
designator C?  Capacitance: 22uF  (hidden comment: *)
Capacitor, Ceramic (MLCC), 22uF, ±10%, 16V, X6S, ±10%, SMD 1206; Manufacturer: Murata Electronics; Manufacturer Part Number: GRT31CC81C226KE01L; Package Size: 1206; JLCPCB Basic Part: No; JLCPCB Part Number: C435410; Supplier 1: LCSC; Category: Capacitors - MLCC; Supplier Part Number 1: C435410; Tolerance: ±10%; Voltage Rating: 16V; Temperature Coefficient: X6S; RoHS: Yes; ComponentLink1Description: Datasheet; ComponentLink1URL: https://wmsc.lcsc.com/wmsc/upload/file/pdf/v2/lcsc/1912111437_Murata-Electronics-GRT31CC81C226KE01L_C435410.pdf; ComponentLink2Description: JLCPCB Part URL; ComponentLink2URL: https://jlcpcb.com/partdetail/C435410; ComponentLink3Description: LCSC Part URL; ComponentLink3URL: https://lcsc.com/product-detail/Multilayer-Ceramic-Capacitors-MLCC---SMD-SMT_Murata-Electronics-Murata-Electronics-GRT31CC81C226KE01L_C435410.html
footprint CAP-1206 (1206 (3216M) Capacitor)
pins: 1, 2

## GRT31CC81C226ME01L
designator C?  Capacitance: 22uF  (hidden comment: *)
Capacitor, Ceramic (MLCC), 22uF, 16V, X6S, SMD 1206; Manufacturer: Murata Electronics; Manufacturer Part Number: GRT31CC81C226ME01L; Package Size: 1206; JLCPCB Basic Part: No; JLCPCB Part Number: C2985039; Supplier 1: LCSC; Category: Capacitors - MLCC; Supplier Part Number 1: C2985039; Voltage Rating: 16V; Temperature Coefficient: X6S; RoHS: Yes; ComponentLink1Description: Datasheet; ComponentLink1URL: https://wmsc.lcsc.com/wmsc/upload/file/pdf/v2/lcsc/2203300930_Murata-Electronics-GRT31CC81C226ME01L_C2985039.pdf; ComponentLink2Description: JLCPCB Part URL; ComponentLink2URL: https://jlcpcb.com/partdetail/C2985039; ComponentLink3Description: LCSC Part URL; ComponentLink3URL: https://lcsc.com/product-detail/Multilayer-Ceramic-Capacitors-MLCC---SMD-SMT_Murata-Electronics-Murata-Electronics-GRT31CC81C226ME01L_C2985039.html
footprint CAP-1206 (1206 (3216M) Capacitor)
pins: 1, 2

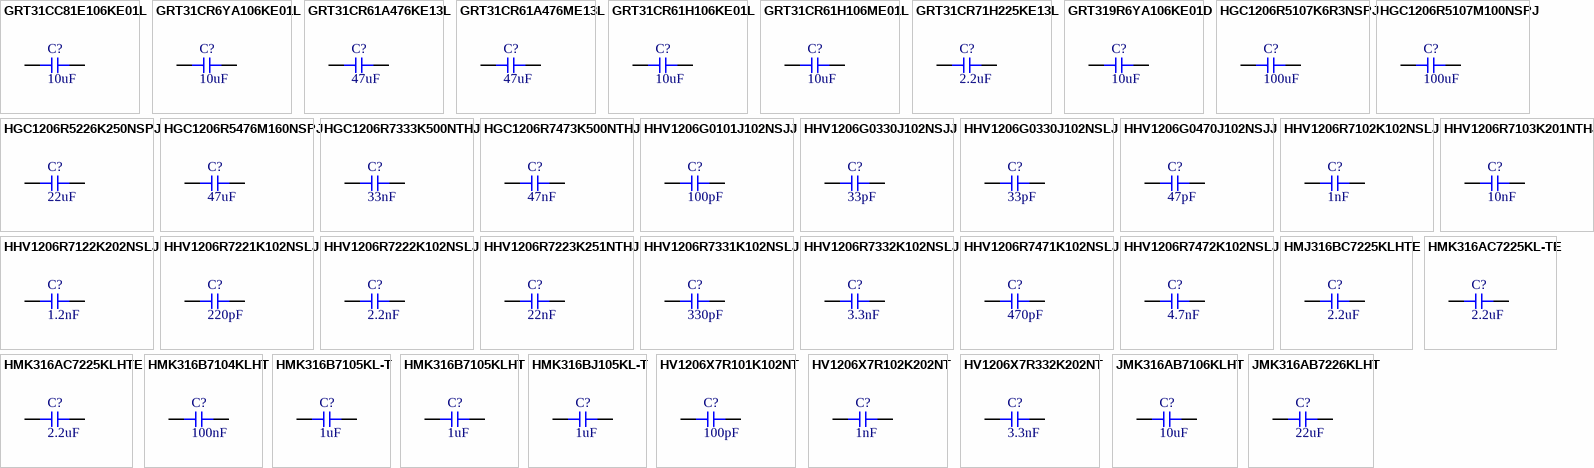
[diagram p51: symbols GRT31CC81E106KE01L to JMK316AB7226KLHT]

## GRT31CC81E106KE01L
designator C?  Capacitance: 10uF  (hidden comment: *)
Capacitor, Ceramic (MLCC), 10uF, ±10%, 25V, X6S, ±10%, SMD 1206; Manufacturer: Murata Electronics; Manufacturer Part Number: GRT31CC81E106KE01L; Package Size: 1206; JLCPCB Basic Part: No; JLCPCB Part Number: C162523; Supplier 1: LCSC; Category: Capacitors - MLCC; Supplier Part Number 1: C162523; Tolerance: ±10%; Voltage Rating: 25V; Temperature Coefficient: X6S; RoHS: Yes; ComponentLink1Description: Datasheet; ComponentLink1URL: https://wmsc.lcsc.com/wmsc/upload/file/pdf/v2/lcsc/1810201235_Murata-Electronics-GRT31CC81E106KE01L_C162523.pdf; ComponentLink2Description: JLCPCB Part URL; ComponentLink2URL: https://jlcpcb.com/partdetail/C162523; ComponentLink3Description: LCSC Part URL; ComponentLink3URL: https://lcsc.com/product-detail/Multilayer-Ceramic-Capacitors-MLCC---SMD-SMT_Murata-Electronics-Murata-Electronics-GRT31CC81E106KE01L_C162523.html
footprint CAP-1206 (1206 (3216M) Capacitor)
pins: 1, 2

## GRT31CR6YA106KE01L
designator C?  Capacitance: 10uF  (hidden comment: *)
Capacitor, Ceramic (MLCC), 10uF, ±10%, 35V, X5R, ±10%, SMD 1206; Manufacturer: Murata Electronics; Manufacturer Part Number: GRT31CR6YA106KE01L; Package Size: 1206; JLCPCB Basic Part: No; JLCPCB Part Number: C2175512; Supplier 1: LCSC; Category: Capacitors - MLCC; Supplier Part Number 1: C2175512; Tolerance: ±10%; Voltage Rating: 35V; Temperature Coefficient: X5R; RoHS: Yes; ComponentLink1Description: Datasheet; ComponentLink1URL: https://wmsc.lcsc.com/wmsc/upload/file/pdf/v2/lcsc/2202040730_Murata-Electronics-GRT31CR6YA106KE01L_C2175512.pdf; ComponentLink2Description: JLCPCB Part URL; ComponentLink2URL: https://jlcpcb.com/partdetail/C2175512; ComponentLink3Description: LCSC Part URL; ComponentLink3URL: https://lcsc.com/product-detail/Multilayer-Ceramic-Capacitors-MLCC---SMD-SMT_Murata-Electronics-Murata-Electronics-GRT31CR6YA106KE01L_C2175512.html
footprint CAP-1206 (1206 (3216M) Capacitor)
pins: 1, 2

## GRT31CR61A476KE13L
designator C?  Capacitance: 47uF  (hidden comment: *)
Capacitor, Ceramic (MLCC), 47uF, ±10%, 10V, X5R, ±10%, SMD 1206; Manufacturer: Murata Electronics; Manufacturer Part Number: GRT31CR61A476KE13L; Package Size: 1206; JLCPCB Basic Part: No; JLCPCB Part Number: C711108; Supplier 1: LCSC; Category: Capacitors - MLCC; Supplier Part Number 1: C711108; Tolerance: ±10%; Voltage Rating: 10V; Temperature Coefficient: X5R; RoHS: Yes; ComponentLink1Description: Datasheet; ComponentLink1URL: https://wmsc.lcsc.com/wmsc/upload/file/pdf/v2/lcsc/2011170205_Murata-Electronics-GRT31CR61A476KE13L_C711108.pdf; ComponentLink2Description: JLCPCB Part URL; ComponentLink2URL: https://jlcpcb.com/partdetail/C711108; ComponentLink3Description: LCSC Part URL; ComponentLink3URL: https://lcsc.com/product-detail/Multilayer-Ceramic-Capacitors-MLCC---SMD-SMT_Murata-Electronics-Murata-Electronics-GRT31CR61A476KE13L_C711108.html
footprint CAP-1206 (1206 (3216M) Capacitor)
pins: 1, 2

## GRT31CR61A476ME13L
designator C?  Capacitance: 47uF  (hidden comment: *)
Capacitor, Ceramic (MLCC), 47uF, ±20%, 10V, X5R, ±20%, SMD 1206; Manufacturer: Murata Electronics; Manufacturer Part Number: GRT31CR61A476ME13L; Package Size: 1206; JLCPCB Basic Part: No; JLCPCB Part Number: C2167841; Supplier 1: LCSC; Category: Capacitors - MLCC; Supplier Part Number 1: C2167841; Tolerance: ±20%; Voltage Rating: 10V; Temperature Coefficient: X5R; RoHS: Yes; ComponentLink1Description: Datasheet; ComponentLink1URL: https://wmsc.lcsc.com/wmsc/upload/file/pdf/v2/lcsc/2202040230_Murata-Electronics-GRT31CR61A476ME13L_C2167841.pdf; ComponentLink2Description: JLCPCB Part URL; ComponentLink2URL: https://jlcpcb.com/partdetail/C2167841; ComponentLink3Description: LCSC Part URL; ComponentLink3URL: https://lcsc.com/product-detail/Multilayer-Ceramic-Capacitors-MLCC---SMD-SMT_Murata-Electronics-Murata-Electronics-GRT31CR61A476ME13L_C2167841.html
footprint CAP-1206 (1206 (3216M) Capacitor)
pins: 1, 2

## GRT31CR61H106KE01L
designator C?  Capacitance: 10uF  (hidden comment: *)
Capacitor, Ceramic (MLCC), 10uF, ±10%, 50V, X5R, ±10%, SMD 1206; Manufacturer: Murata Electronics; Manufacturer Part Number: GRT31CR61H106KE01L; Package Size: 1206; JLCPCB Basic Part: No; JLCPCB Part Number: C417124; Supplier 1: LCSC; Category: Capacitors - MLCC; Supplier Part Number 1: C417124; Tolerance: ±10%; Voltage Rating: 50V; Temperature Coefficient: X5R; RoHS: Yes; ComponentLink1Description: Datasheet; ComponentLink1URL: https://wmsc.lcsc.com/wmsc/upload/file/pdf/v2/lcsc/2001031609_Murata-Electronics-GRT31CR61H106KE01L_C417124.pdf; ComponentLink2Description: JLCPCB Part URL; ComponentLink2URL: https://jlcpcb.com/partdetail/C417124; ComponentLink3Description: LCSC Part URL; ComponentLink3URL: https://lcsc.com/product-detail/Multilayer-Ceramic-Capacitors-MLCC---SMD-SMT_Murata-Electronics-Murata-Electronics-GRT31CR61H106KE01L_C417124.html
footprint CAP-1206 (1206 (3216M) Capacitor)
pins: 1, 2

## GRT31CR61H106ME01L
designator C?  Capacitance: 10uF  (hidden comment: *)
Capacitor, Ceramic (MLCC), 10uF, ±20%, 50V, X5R, ±20%, SMD 1206; Manufacturer: Murata Electronics; Manufacturer Part Number: GRT31CR61H106ME01L; Package Size: 1206; JLCPCB Basic Part: No; JLCPCB Part Number: C363964; Supplier 1: LCSC; Category: Capacitors - MLCC; Supplier Part Number 1: C363964; Tolerance: ±20%; Voltage Rating: 50V; Temperature Coefficient: X5R; RoHS: Yes; ComponentLink1Description: Datasheet; ComponentLink1URL: https://wmsc.lcsc.com/wmsc/upload/file/pdf/v2/lcsc/1912111437_Murata-Electronics-GRT31CR61H106ME01L_C363964.pdf; ComponentLink2Description: JLCPCB Part URL; ComponentLink2URL: https://jlcpcb.com/partdetail/C363964; ComponentLink3Description: LCSC Part URL; ComponentLink3URL: https://lcsc.com/product-detail/Multilayer-Ceramic-Capacitors-MLCC---SMD-SMT_Murata-Electronics-Murata-Electronics-GRT31CR61H106ME01L_C363964.html
footprint CAP-1206 (1206 (3216M) Capacitor)
pins: 1, 2

## GRT31CR71H225KE13L
designator C?  Capacitance: 2.2uF  (hidden comment: *)
Capacitor, Ceramic (MLCC), 2.2uF, ±10%, null, X7R, ±10%, SMD 1206; Manufacturer: Murata Electronics; Manufacturer Part Number: GRT31CR71H225KE13L; Package Size: 1206; JLCPCB Basic Part: No; JLCPCB Part Number: C909839; Supplier 1: LCSC; Category: Capacitors - MLCC; Supplier Part Number 1: C909839; Tolerance: ±10%; Voltage Rating: null; Temperature Coefficient: X7R; RoHS: Yes; ComponentLink1Description: Datasheet; ComponentLink1URL: https://wmsc.lcsc.com/wmsc/upload/file/pdf/v2/lcsc/2304140030_Murata-Electronics-GRT31CR71H225KE13L_C909839.pdf; ComponentLink2Description: JLCPCB Part URL; ComponentLink2URL: https://jlcpcb.com/partdetail/C909839; ComponentLink3Description: LCSC Part URL; ComponentLink3URL: https://lcsc.com/product-detail/Multilayer-Ceramic-Capacitors-MLCC---SMD-SMT_Murata-Electronics-Murata-Electronics-GRT31CR71H225KE13L_C909839.html
footprint CAP-1206 (1206 (3216M) Capacitor)
pins: 1, 2

## GRT319R6YA106KE01D
designator C?  Capacitance: 10uF  (hidden comment: *)
Capacitor, Ceramic (MLCC), 10uF, ±10%, 35V, X5R, ±10%, SMD 1206; Manufacturer: Murata Electronics; Manufacturer Part Number: GRT319R6YA106KE01D; Package Size: 1206; JLCPCB Basic Part: No; JLCPCB Part Number: C3831077; Supplier 1: LCSC; Category: Capacitors - MLCC; Supplier Part Number 1: C3831077; Tolerance: ±10%; Voltage Rating: 35V; Temperature Coefficient: X5R; RoHS: Yes; ComponentLink1Description: Datasheet; ComponentLink1URL: https://wmsc.lcsc.com/wmsc/upload/file/pdf/v2/lcsc/2207121430_Murata-Electronics-GRT319R6YA106KE01D_C3831077.pdf; ComponentLink2Description: JLCPCB Part URL; ComponentLink2URL: https://jlcpcb.com/partdetail/C3831077; ComponentLink3Description: LCSC Part URL; ComponentLink3URL: https://lcsc.com/product-detail/Multilayer-Ceramic-Capacitors-MLCC---SMD-SMT_Murata-Electronics-Murata-Electronics-GRT319R6YA106KE01D_C3831077.html
footprint CAP-1206 (1206 (3216M) Capacitor)
pins: 1, 2

## HGC1206R5107K6R3NSPJ
designator C?  Capacitance: 100uF  (hidden comment: *)
Capacitor, Ceramic (MLCC), 100uF, ±10%, 6.3V, X5R, ±10%, SMD 1206; Manufacturer: Chinocera; Manufacturer Part Number: HGC1206R5107K6R3NSPJ; Package Size: 1206; JLCPCB Basic Part: No; JLCPCB Part Number: C7432783; Supplier 1: LCSC; Category: Capacitors - MLCC; Supplier Part Number 1: C7432783; Tolerance: ±10%; Voltage Rating: 6.3V; Temperature Coefficient: X5R; RoHS: Yes; ComponentLink1Description: Datasheet; ComponentLink1URL: https://wmsc.lcsc.com/wmsc/upload/file/pdf/v2/lcsc/2403201122_Chinocera-HGC1206R5107K6R3NSPJ_C7432783.pdf; ComponentLink2Description: JLCPCB Part URL; ComponentLink2URL: https://jlcpcb.com/partdetail/C7432783; ComponentLink3Description: LCSC Part URL; ComponentLink3URL: https://lcsc.com/product-detail/Multilayer-Ceramic-Capacitors-MLCC---SMD-SMT_Chinocera-Chinocera-HGC1206R5107K6R3NSPJ_C7432783.html
footprint CAP-1206 (1206 (3216M) Capacitor)
pins: 1, 2

## HGC1206R5107M100NSPJ
designator C?  Capacitance: 100uF  (hidden comment: *)
Capacitor, Ceramic (MLCC), 100uF, ±20%, 10V, X5R, ±20%, SMD 1206; Manufacturer: Chinocera; Manufacturer Part Number: HGC1206R5107M100NSPJ; Package Size: 1206; JLCPCB Basic Part: No; JLCPCB Part Number: C7432784; Supplier 1: LCSC; Category: Capacitors - MLCC; Supplier Part Number 1: C7432784; Tolerance: ±20%; Voltage Rating: 10V; Temperature Coefficient: X5R; RoHS: Yes; ComponentLink1Description: Datasheet; ComponentLink1URL: https://wmsc.lcsc.com/wmsc/upload/file/pdf/v2/lcsc/2403201122_Chinocera-HGC1206R5107M100NSPJ_C7432784.pdf; ComponentLink2Description: JLCPCB Part URL; ComponentLink2URL: https://jlcpcb.com/partdetail/C7432784; ComponentLink3Description: LCSC Part URL; ComponentLink3URL: https://lcsc.com/product-detail/Multilayer-Ceramic-Capacitors-MLCC---SMD-SMT_Chinocera-Chinocera-HGC1206R5107M100NSPJ_C7432784.html
footprint CAP-1206 (1206 (3216M) Capacitor)
pins: 1, 2

## HGC1206R5226K250NSPJ
designator C?  Capacitance: 22uF  (hidden comment: *)
Capacitor, Ceramic (MLCC), 22uF, ±10%, 25V, X5R, ±10%, SMD 1206; Manufacturer: Chinocera; Manufacturer Part Number: HGC1206R5226K250NSPJ; Package Size: 1206; JLCPCB Basic Part: No; JLCPCB Part Number: C7432785; Supplier 1: LCSC; Category: Capacitors - MLCC; Supplier Part Number 1: C7432785; Tolerance: ±10%; Voltage Rating: 25V; Temperature Coefficient: X5R; RoHS: Yes; ComponentLink1Description: Datasheet; ComponentLink1URL: https://wmsc.lcsc.com/wmsc/upload/file/pdf/v2/lcsc/2403201122_Chinocera-HGC1206R5226K250NSPJ_C7432785.pdf; ComponentLink2Description: JLCPCB Part URL; ComponentLink2URL: https://jlcpcb.com/partdetail/C7432785; ComponentLink3Description: LCSC Part URL; ComponentLink3URL: https://lcsc.com/product-detail/Multilayer-Ceramic-Capacitors-MLCC---SMD-SMT_Chinocera-Chinocera-HGC1206R5226K250NSPJ_C7432785.html
footprint CAP-1206 (1206 (3216M) Capacitor)
pins: 1, 2
